# Altium schematic symbol library LimeMicroAltiumLib.SchLib: 590 symbols (part 10 of 13) (continued)
## MAX40203AUK+T_ideal_diode (continued)

## MBR0530T1G_shottky_diode
designator D?, comment MBR0530T1G
Part Description: Diode Schottky 30V 500mA Surface Mount SOD-123; Manufacturer: ON Semiconductor / Fairchild; Voltage: 30V; Average Rectified Current: 500mA; Element Configuration: Single; Max Surge Current: 5.5A; Max Reverse Leakage Current: 130uA; Forward Voltage: 430mV; Current: 5A; ComponentLink1URL: http://www.mouser.com/ds/2/427/mmsz5225-102133.pdf; ComponentLink1Description: http://www.mouser.com/ds/2/427/mmsz5225-102133.pdf; Supplier 1: Digi-Key; Manufacturer Part Number: MBR0530T1G; Stock 1: 121944; Pricing 1: 1 = 0,35000, 10 = 0,28600, 100 = 0,15180, 500 = 0,09986, 1000 = 0,06791 (USD); Mount: Surface Mount; Case/Package: SOD; Number of Pins: 2; Contact Plating: Matte,Tin; Min Operating Temperature: -65°C; Max Operating Temperature: 125°C; Package Quantity: 3000; Packaging: Tape and Reel; Max Reverse Voltage (DC): 30V; Forward Current: 500mA; Max Repetitive Reverse Voltage (Vrrm): 30V; Max Forward Surge Current (Ifsm): 5.5A; Peak Reverse Current: 130uA; Peak Non-Repetitive Surge Current: 5.5A; Length: 2.69mm; Height: 1.12mm; Width: 1.6mm; Radiation Hardening: No; REACH SVHC: No SVHC; ComponentLink2URL: http://www.farnell.com/datasheets/1708258.pdf; ComponentLink2Description: http://www.farnell.com/datasheets/1708258.pdf; ComponentLink3URL: https://www.distrelec.biz/Web/Downloads/26/_e/sz600926_e.pdf?mime=application%2Fpdf; ComponentLink3Description: https://www.distrelec.biz/Web/Downloads/26/_e/sz600926_e.pdf?mime=application%2Fpdf; ComponentLink4URL: http://www.onsemi.com/pub_link/Collateral/MBR0530T1-D.PDF; ComponentLink4Description: http://www.onsemi.com/pub_link/Collateral/MBR0530T1-D.PDF; ComponentLink5URL: http://www.alliedelec.com/m/d/65b97ea0ac6fde880d352b291ad3d7d6.pdf; ComponentLink5Description: http://www.alliedelec.com/m/d/65b97ea0ac6fde880d352b291ad3d7d6.pdf; ComponentLink6URL: http://www.farnell.com/datasheets/85890.pdf; ComponentLink6Description: http://www.farnell.com/datasheets/85890.pdf; ComponentLink7URL: http://www.onsemi.com/pub/Collateral/MBR0530T1-D.PDF; ComponentLink7Description: http://www.onsemi.com/pub/Collateral/MBR0530T1-D.PDF; Supplier Part Number 1: MBR0530T1GOSCT-ND
footprint MBR0530T1G_shottky_diode_SOD123
pins: A, C

## MBR0540T1G_shottky_diode
designator VD?, comment MBR0540T1G
Part Description: Diode Schottky 40V 500mA Surface Mount SOD-123; Manufacturer: ON Semiconductor; Manufacturer Part Number 1: MBR0540T1G; Supplier Part Number 1: MBR0540T1GOSCT-ND; Supplier 1: Digi-Key
footprint MBR0530T1G_shottky_diode_SOD123
pins: A, C

## MC100EL16DG
designator IC?
5.0 V ECL Differential Receiver; Manufacturer: ON Semiconductor; Manufacturer Part Number 1: MC100EL16DG; Supplier Part Number 1: 863-MC100EL16DG; Part Description: 5.0 V ECL Differential Receiver; Supplier 1: Mouser
footprint MC100EL16_SOIC-8
pins: 1 NC, 2 D, 3 ~{D}, 4 VBB (out), 5 VEE (power), 6 ~{Q}, 7 Q, 8 VCC (power)

## MC-1010-G_GNSS_MODULE
designator IC?, comment MC-1010-G
Part Description: LOCOSYS MC-1010-G complete standalone GNSS module; GPS, GLONASS, GALILEO, QZSS and SBAS, 99-channel GNSS, Up to 10 Hz update rate, ±11ns high accuracy time pulse (1PPS), 10.1 x 9.7 x 2 mm; Manufacturer: Locosys; Manufacturer Part Number 1: MC-1010-G; Supplier Part Number 1: MC-1010-G; Supplier 1: Locosys
footprint MC-1010-G_GNSS_MODULE
pins: 1 GND, 2 TX (out), 3 RX (in), 4 TIMEPULSE (out), 5 NC, 6 V_BCKP, 7 NC, 8 VCC (power), 9 NC, 10 GND, 11 RF_IN (in), 12 GND, 13 NC, 14 VCC_RF, 15 NC, 16 NC, 17 GPIO (io), 18 GPIO (io)

## MCP1525T-I/TT
designator IC?
2.5V Voltage Reference, 3-Pin SOT-23, Industrial Temperature, Tape and Reel; Manufacturer: Microchip Technology; Manufacturer Part Number 1: MCP1525T-I/TT; Reference Type: Series; Output Type: Fixed; Current - Output: 2mA; Tolerance: ±1%; Temperature Coefficient: 50ppm/°C; Noise - 0.1Hz to 10Hz: 90µVp-p; Noise - 10Hz to 10kHz: 500µVrms; Voltage - Input: 2.7 V ~ 5.5 V; Current - Supply: 120µA; PackageDescription: Series Voltage Reference IC ±1% 2mA SOT-23-3; Supplier 1: Digi-Key; RoHS: RoHS Compliant; Category: Integrated Circuits (ICs); Stock 1: 16612; Pricing 1: 1=0.77, 25=0.64, 100=0.58 (USD); Packaging: Digi-Reel®; Part Status: Active; Voltage - Output (Min/Fixed): 2.5V; Voltage - Output (Max): -; Current - Cathode: -; Operating Temperature: -40°C ~ 85°C (TA); Mounting Type: Surface Mount; Package / Case: TO-236-3, SC-59, SOT-23-3; Supplier Device Package: SOT-23-3; ComponentLink1URL: http://www.microchip.com/mymicrochip/filehandler.aspx?ddocname=en011331; ComponentLink1Description: http://www.microchip.com/mymicrochip/filehandler.aspx?ddocname=en011331; Supplier Part Number 1: MCP1525T-I/TTDKR-ND
footprint SOT23-3_v2 (SOT23, 3 pin)
pins: 1 IN (power), 2 OUT (power), 3 VSS (power)

## MCP3204-BI/SL
designator IC?, comment MCP3204
2.7V 4-Channel/8-Channel 12-Bit A/D Converters with SPI Serial Interface, 14-Pin SOIC 150mil, B Performance Grade, Industrial Temperature; Manufacturer: Microchip; PartNumber: MCP3204-BI/SL; DatasheetVersion: revE, Sep-2008; PackageVersion: revBB, Aug-2009; PackageReference: SOIC-SL14; PackageDescription: 14-Lead Plastic Small Outline (SL) - Narrow, 3.90mm Body [SOIC]; Supplier 1: Digi-Key; Supplier Part Number 1: MCP3204-BI/SL-ND; Supplier 2: Farnell; Supplier Part Number 2: 1852019; Supplier 3: Newark; Supplier Part Number 3: 23C2838; Supplier 4: Mouser; Supplier Part Number 4: 579-MCP3204-BI/SL; Mounting Technology: Surface Mount; Code_JEDEC: MS-012-AB; Code_IPC: SOIC127P600-14; ComponentLink1Description: Manufacturer URL; ComponentLink1URL: http://www.microchip.com/; ComponentLink2Description: Datasheet; ComponentLink2URL: http://ww1.microchip.com/downloads/en/DeviceDoc/21298e.pdf; ComponentLink3Description: Package Specification; ComponentLink3URL: http://www.microchip.com/stellent/groups/techpub_sg/documents/packagingspec/en012702.pdf
footprint SOIC-SL14_M (SOIC, 14-Leads, Body 8.7x3.9mm, Pitch 1.27mm, IPC Low Density)
pins: 1 CH0 (in), 2 CH1 (in), 3 CH2 (in), 4 CH3 (in), 5 NC, 6 NC, 7 DGND (power), 8 ~{CS}/SHDN (in), 9 DIN (in), 10 DOUT (hiz), 11 CLK (in), 12 AGND (power), 13 VREF (in), 14 VDD (power)

## MCP3208-CI/SL
designator IC?, comment MCP3208
2.7V 4-Channel/8-Channel 12-Bit A/D Converters with SPI Serial Interface, 16-Pin SOIC 150mil, C Performance Grade, Industrial Temperature; Manufacturer: Microchip; PartNumber: MCP3208-CI/SL; Manufacturer Part Number 1: MCP3208T-CI/SL; Part Description: 12 Bit Analog to Digital Converter 4, 8 Input 1 SAR 16-SOIC; PackageVersion: revBB, Aug-2009; PackageReference: SOIC-SL16; PackageDescription: 16-Lead Plastic Small Outline (SL) - Narrow, 3.90mm Body [SOIC]; Supplier 1: Digi-Key; Mounting Technology: Surface Mount; Supplier Part Number 1: MCP3208T-CI/SLCT-ND
footprint MCP3208-CI/SL_SOIC16 (SOIC, 16-Leads, Body 9.9x3.9mm, Pitch 1.27mm, IPC Low Density)
pins: 1 CH0 (in), 2 CH1 (in), 3 CH2 (in), 4 CH3 (in), 5 CH4 (in), 6 CH5 (in), 7 CH6 (in), 8 CH7 (in), 9 DGND (power), 10 ~{CS}/SHDN (in), 11 DIN (in), 12 DOUT (hiz), 13 CLK (in), 14 AGND (power), 15 VREF (in), 16 VDD (power)

## MCP4251
designator IC?
Manufacturer Part Number 1: MCP4251-103E/SL; Manufacturer: Microchip Technology; Configuration: Potentiometer; Voltage - Supply: 1.8 V ~ 5.5 V; Resistance - Wiper (Ohms) (Typ): 75; Temperature Coefficient (Typ): 150 ppm/°C; Number of Taps: 257; Interface: SPI; Memory Type: Volatile; Number of Circuits: 2; Resistance (Ohms): 10k; Supplier 1: Digi-Key; RoHS: RoHS Compliant; Category: Integrated Circuits (ICs); Features: -; Operating Temperature: -40°C ~ 125°C; Supplier Device Package: 14-SOIC; Tolerance: -; Package / Case: 14-SOIC (0.154", 3.90mm Width); Packaging: Tube; Taper: Linear; Supplier Part Number 1: MCP4251-103E/SL-ND
footprint SOIC14 (14-Pin Small Outline Integrated Circuit 1.27 mm Pitch)
pins: 1 ~{CS} (in), 2 SCK (in), 3 SDI (in), 4 VSS (in), 5 P1B (in), 6 P1W (in), 7 P1A (in), 8 P0A (in), 9 P0W (in), 10 P0B (in), 11 ~{WP} (in), 12 ~{SHDN} (in), 13 SDO (in), 14 VDD (power)

## MCP23017-E/ML_I2C_expander
designator IC?, comment MCP23017-E/ML
Part Description: I/O Expander 16 I²C 1.7 MHz 28-QFN (6x6); Manufacturer: Microchip; ComponentLink1URL: https://datasheet.ciiva.com/1496/12179-1496011.pdf?src-supplier=Element14; ComponentLink1Description: https://datasheet.ciiva.com/1496/12179-1496011.pdf?src-supplier=Element14; ComponentLink2URL: https://datasheet.ciiva.com/1780/21952b-1780121.pdf?src-supplier=Digi-Key; ComponentLink2Description: https://datasheet.ciiva.com/1780/21952b-1780121.pdf?src-supplier=Digi-Key; ComponentLink3URL: https://datasheet.ciiva.com/3149/21952b-3149158.pdf?src-supplier=Avnet; ComponentLink3Description: https://datasheet.ciiva.com/3149/21952b-3149158.pdf?src-supplier=Avnet; ComponentLink4URL: https://datasheet.ciiva.com/16222/filehandler-aspxddocname-en023709-16222331.pdf?src-supplier=Future+Electronics; ComponentLink4Description: https://datasheet.ciiva.com/16222/filehandler-aspxddocname-en023709-16222331.pdf?src-supplier=Future+Electronics; Supplier 1: Digi-Key; Supplier Part Number 1: MCP23017-E/ML-ND; Manufacturer Part Number 1: MCP23017-E/ML; Stock 1: 3965; Pricing 1: 1=1,9, 25=1,59, 100=1,44 (USD); RoHS: Yes
footprint MCP23017-E/ML_QFN28
pins: 1 GPB4 (io), 2 GPB5 (io), 3 GPB6 (io), 4 GPB7 (io), 5 VDD (power), 6 VSS (power), 7 NC, 8 SCL (in), 9 SDA (io), 10 NC, 11 A0 (in), 12 A1 (in), 13 A2 (in), 14 ~{RESET} (in), 15 INTB (oc), 16 INTA (oc), 17 GPA0 (io), 18 GPA1 (io), 19 GPA2 (io), 20 GPA3 (io), 21 GPA4 (io), 22 GPA5 (io), 23 GPA6 (io), 24 GPA7 (io), 25 GPB0 (io), 26 GPB1 (io), 27 GPB2 (io), 28 GPB3 (io), PAD GND

## MIC2033_power_switch
designator IC?, comment MIC2033
Manufacturer: Microchip; Manufacturer Part Number 1: MIC2033-05AYM6-TR; Part Description: Power Switch ICs - Power Distribution 500mA High-Side, Power Distribution Switch; Number of Outputs: 1; Interface: On/Off; Max Output Current: 500mA; Fault Protection: Over Temperature; Output Configuration: High Side; Supplier 1: Digi-Key; Supplier Part Number 1: 576-4143-1-ND; Stock 1: 1966; Pricing 1: 1=0,80000, 25=0,65720, 100=0,61500 (USD); RoHS: Yes; Mount: Surface Mount; Case/Package: SOT-23-6; Number of Pins: 6; Min Operating Temperature: -40°C; Max Operating Temperature: 125°C; Packaging: Tape and Reel; Package Quantity: 3000; Series: -; Number of Switches: 1; RoHS Compliant: Yes; ComponentLink1URL: http://www.mouser.com/ds/2/268/mic2033-b-1076865.pdf?src-supplier=Mouser; ComponentLink1Description: http://www.mouser.com/ds/2/268/mic2033-b-1076865.pdf?src-supplier=Mouser; ComponentLink2URL: http://components.arrow.com/part/dataview/56727820S413982N1374?src-supplier=Arrow+Electronics; ComponentLink2Description: http://components.arrow.com/part/dataview/56727820S413982N1374?src-supplier=Arrow+Electronics; ComponentLink3URL: http://www.microchip.com/mymicrochip/filehandler.aspx?ddocname=en579457&src-supplier=Digi-Key; ComponentLink3Description: http://www.microchip.com/mymicrochip/filehandler.aspx?ddocname=en579457&src-supplier=Digi-Key
footprint SOT23-6
pins: 1 VIN (in), 2 GND, 3 EN (in), 4 FAULT/ (out), 5 CSLEW (out), 6 VOUT (out)

## MIC37122
designator IC?
Voltage - Input: 2.375 V ~ 5.5 V; Supplier 1: Digi-Key; Supplier: Digi-Key; Package / Case: 8-SOIC (0.154", 3.90mm Width); Supplier Part Number: 576-4334-2-ND
footprint MIC37122YM TR_SO8 (SOIC, 8-Leads, Body 4,90x3,90mm, Pitch 1,27mm, IPC Medium Density)
pins: 1 EN, 2 IN, 3 OUT, 4 ADJ, 5 GND, 6 GND, 7 GND, 8 GND

## MIC38300
designator IC?
Manufacturer: Microchip Technology; Manufacturer Part Number 1: MIC38300HYHL-TR; Current - Output (Max): 3A; Voltage - Input (Min): 3V; Voltage - Input (Max): 5.5V; Voltage - Output 1: 1 ~ 5 V; Number of Outputs: 1; Supplier 1: Digi-Key; Features: OCP, OVP, UVLO; Voltage - Output 2: -; Applications: ITE (Commercial); Package / Case: 28-PowerVQFN Variant, 28-MLF®; Mounting Type: Surface Mount; RoHS: RoHS Compliant; Size / Dimension: 0.236" L x 0.158" W (6.00mm x 4.00mm); Voltage - Isolation: -; Power (Watts) - Manufacture Series: -; Type: Non-Isolated PoL Module; Efficiency: -; Voltage - Output 3: -; Packaging: Cut Tape (CT); Operating Temperature: -40°C ~ 125°C; Power (Watts) - Max: -; Category: Power Supplies - Board Mount; Supplier Part Number 1: 576-2960-1-ND
pins: 1 SWO, 2 SWO, 3 SWO, 4 SWO, 5 SWO, 6 SW, 7 ePAD, 8 AVIN, 9 LPF, 10 AGND, 11 FB, 12 LDOOUT, 13 LDOOUT, 14 LDOIN, 15 LDOIN, 16 PVIN, 17 PVIN, 18 EN, 19 PGND, 20 PGND, 21 PGND, 22 ePAD, 23 SW, 24 SW, 25 SW, 26 SW, 27 SW, 28 SW

## MICRO_SD_114-00841-68
designator J?, comment Micro SD card holder
Manufacturer: Amphenol Commercial Products; Manufacturer Part Number: 114-00841-68; Part Description: 10 (8 + 2) Position Card Connector Secure Digital - microSD™ Surface Mount, Right Angle Gold; Card Type: Secure Digital - microSD™; Number of Positions: 10 (8 + 2); Connector Type: Connector; Insertion, Removal Method: Push In, Pull Out; Supplier 1: Digi-Key; RoHS: RoHS Compliant; Category: Connectors, Interconnects; Stock 1: 5866; Pricing 1: 1=1.5, 10=1.358, 25=1.2752, 50=1.2196, 100=1.1642, 250=1.05336, 500=0.9702 (USD); Packaging: Cut Tape (CT); Part Status: Active; Ejector Side: -; Mounting Type: Surface Mount, Right Angle; Features: Switch; Height Above Board: 0.061" (1.55mm); Mounting Feature: Normal, Standard - Top; Contact Finish: Gold; Contact Finish Thickness: 15.0µin (0.38µm); ComponentLink1URL: https://www.amphenolcanada.com/ProductSearch/drawings/AC/1140084168.pdf; ComponentLink1Description: https://www.amphenolcanada.com/ProductSearch/drawings/AC/1140084168.pdf; Supplier Part Number 1: 114-00841-68-1-ND
footprint MICRO_SD_CARD_114-00841-68
pins: 1 Date Line [Bit 2], 2 Card Detect/ Data Line [Bit 3], 3 Command/Response, 4 Supply Voltage, 5 Clock, 6 GND, 7 Data Line [Bit 0], 8 Data Line [Bit 1], 12 CD_SW_B, 13 CD_SW_A

## Micro_USB3_A
designator J?, comment Micro_USB3A
footprint microUSB3A_SM
pins: 1 VBUS, 2 D-, 3 D+, 4 GND, 5 MicB_SSRX-, 6 MicB_SSRX+, 7 GND_DRAIN, 8 MicB_SSTX-, 9 MicB_SSTX+, 12 Shield

## Micro_USB3_B
designator J?, comment Micro_USB3B
Specifications: USB 3.0, Super Speed; Connector Type: USB - micro B; Supplier 1: Digi-Key; Mounting Type: Surface Mount, Right Angle, Horizontal; Category: Connectors, Interconnects; Supplier: Digi-Key; Supplier Part Number: GSB343K33HRCT-ND
pins: 1 VBUS, 2 D-, 3 D+, 4 ID, 5 GND, 6 MicB_SSTX-, 7 MicB_SSTX+, 8 GND_DRAIN, 9 MicB_SSRX-, 10 MicB_SSRX+, 11 Shield, 12 Shield

## MicroSD_card
designator J?
Supplier 1: Digi-Key; Supplier Part Number 1: HR1964CT-ND
pins: 1 DAT2, 2 CD/DAT3, 3 CMD, 4 VDD, 5 CLK, 6 VSS, 7 DAT0, 8 DAT1, 9 CD_SW_B, 10 CD_SW_A

## Mictor_38pin
designator J?
Manufacturer: TE CONNECTIVITY / AMP; Manufacturer Part Number: 2-5767004-2; Contact Termination Type: Surface Mount; Pitch Spacing: 0.64; No. of Contacts: 38; Gender: Receptacle; No. of Rows: 2; Row Pitch: 7.06; Supplier 1: Newark; Series: MICTOR; Contact Plating: Gold; Supplier Part Number 1: 24K3655
footprint AMP_MICTOR38
pins: 1 +5V, 2 DNC, 3 GND_DC, 4 DNC, 5 CLKe, 6 CLKo, 7 D15e, 8 D15o, 9 D14e, 10 D14o, 11 D13e, 12 D13o, 13 D12e, 14 D12o, 15 D11e, 16 D11o, 17 D10e, 18 D10o, 19 D9e, 20 D9o, 21 D8e, 22 D8o, 23 D7e, 24 D7o, 25 D6e, 26 D6o, 27 D5e, 28 D5o, 29 D4e, 30 D4o, 31 D3e, 32 D3o, 33 D2e, 34 D2o, 35 D1e, 36 D1o, 37 D0e, 38 D0o

## MINI_HDMI_Wurth_685119248123
designator J?, comment Mini HDMI
Also compatible with Molex 0467651301 and Amphenol 10118242-001RLF; Manufacturer: Wurth Electronics; Manufacturer Part Number 1: 685119248123; Part Description: HDMI - Micro - Receptacle Connector 19 Position Surface Mount, Right Angle; Through Hole; Body Material: Brass; Number of Contacts: 19; Gender: Receptacle; Supplier 1: RSComponents; Supplier Part Number 1: 1621823; Stock 1: 1; Pricing 1: 1000=1,80500, 5000=1,73500, 10000=1,68900, 15000=1,64400, 20000=1,60100 (USD); RoHS: Yes; Mount: Surface Mount,Horizontal; Contact Plating: Gold; Package Quantity: 1000; Packaging: Tape and Reel; Connector Type: HDMI; Features: Shielded; REACH SVHC: Unknown; RoHS Compliant: Yes; ComponentLink1URL: https://datasheet.ciiva.com/29660/685119248123-29660258.pdf?src-supplier=Digi-Key; ComponentLink1Description: https://datasheet.ciiva.com/29660/685119248123-29660258.pdf?src-supplier=Digi-Key
footprint MINI_HDMI_Wurth_685119248123 (Also compatible with Molex 0467651301 and Amphenol 10118242-001RLF)
pins: 1 Hot Plug Detect / HEAC-, 2 Utility / HEAC+, 3 TMDS Data2+, 4 TMDS Data2 Shield, 5 TMDS Data2-, 6 TMDS Data1+, 7 TMDS Data1 Shield, 8 TMDS Data1-, 9 TMDS Data0+, 10 TMDS Data0 Shield, 11 TMDS Data0-, 12 TMDS Clock+, 13 TMDS Clock Shield, 14 TMDS Clock-, 15 CEC, 16 DDC / CEC Ground / HEAC Shield, 17 SCL, 18 SDA, 19 +5V Power, Shell Shield

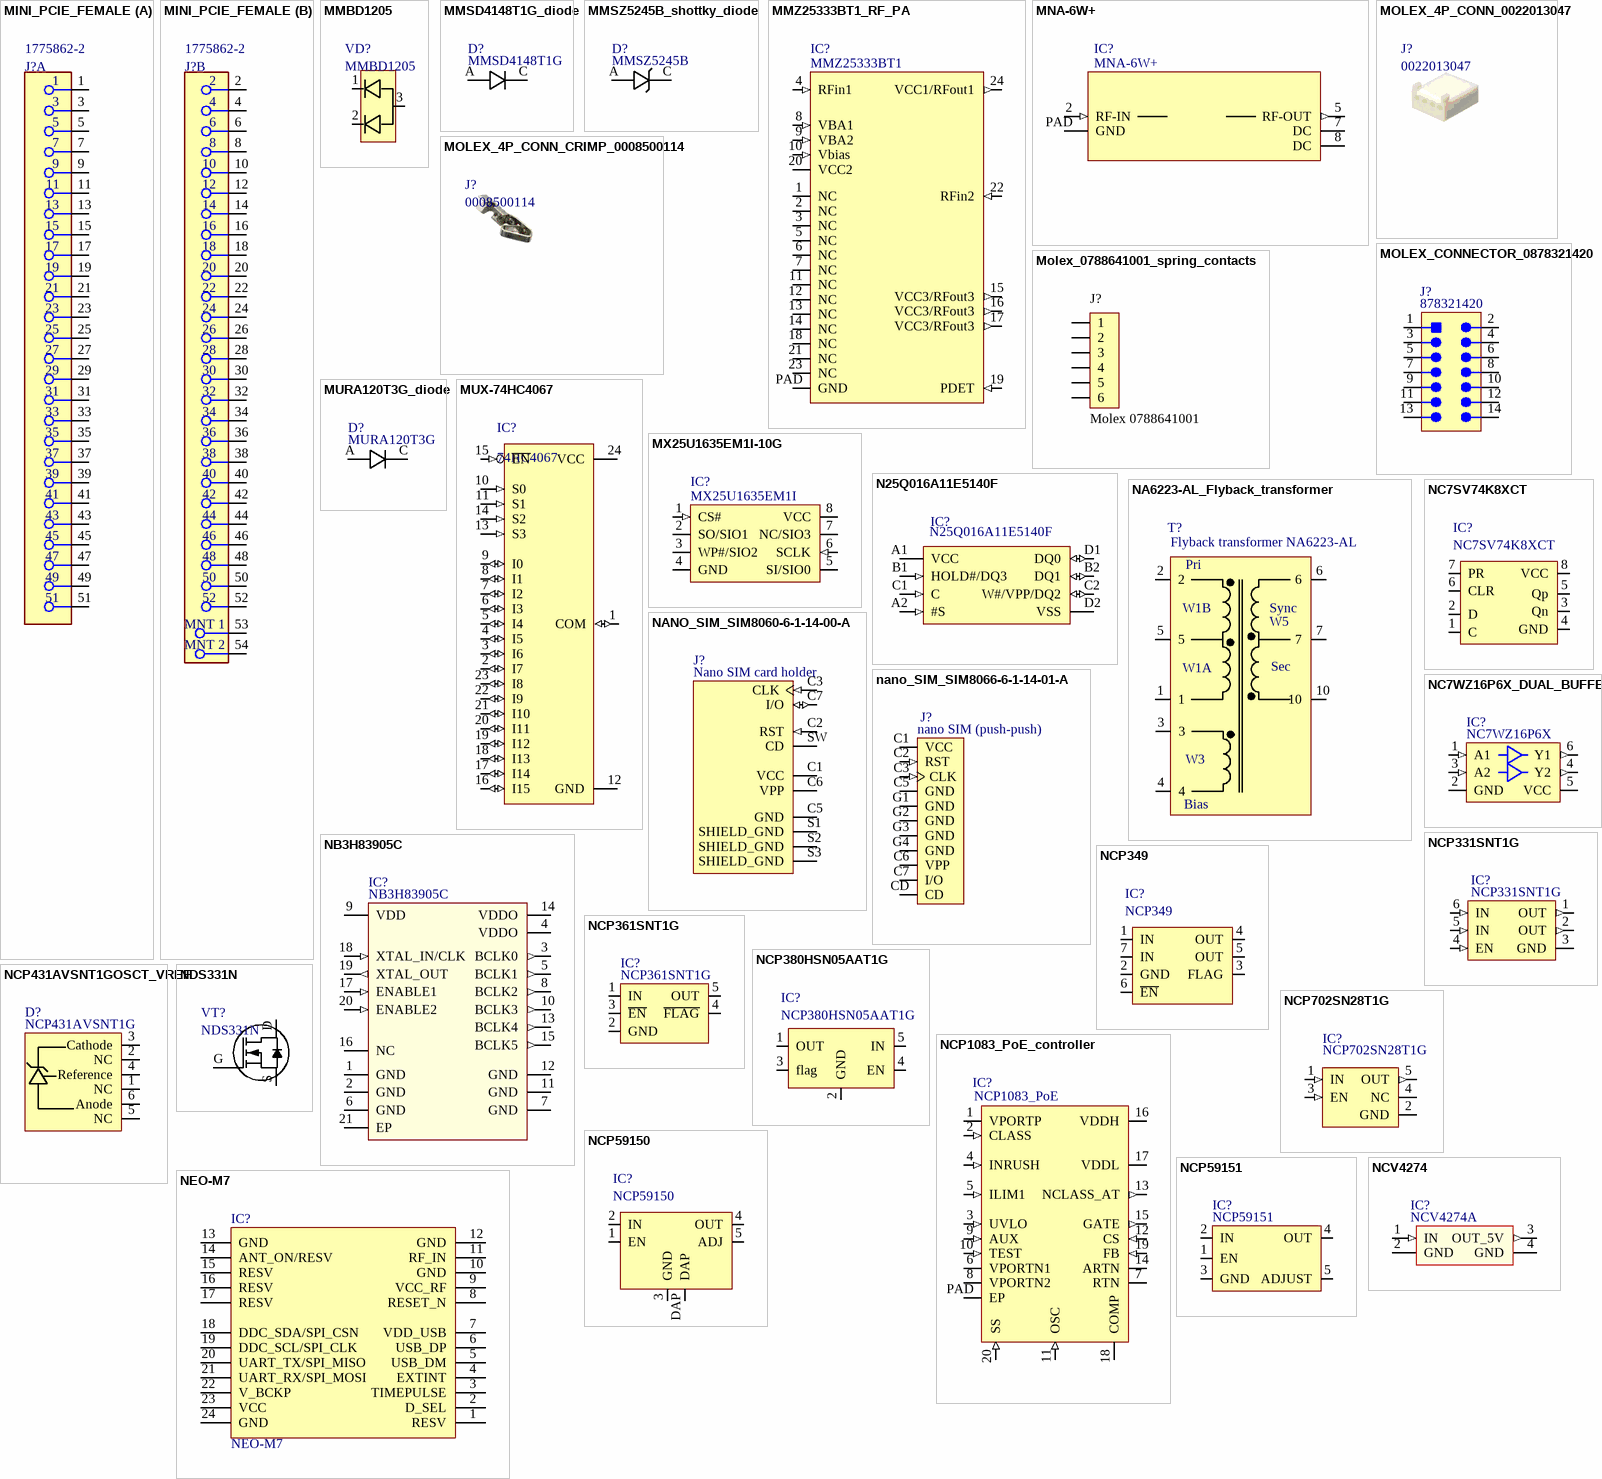
[diagram p59: symbols MINI_PCIE_FEMALE to NEO-M7]

## MINI_PCIE_FEMALE
designator J?, comment 1775862-2
CONN PCI EXP MINI FEMALE 52POS; Part Description: 52 Position Female Connector PCI Express Mini Card Gold 0.031" (0.80mm) Black; Manufacturer: TE Connectivity AMP; Manufacturer Part Number 1: 2041262-1; ComponentLink1URL: https://www.mouser.com/ds/2/418/NG_DS_8-1773459-7_EXPRESS_MINI_CARD_QRG_0816-907003.pdf?src-supplier=Mouser; ComponentLink1Description: https://www.mouser.com/ds/2/418/NG_DS_8-1773459-7_EXPRESS_MINI_CARD_QRG_0816-907003.pdf?src-supplier=Mouser; ComponentLink2URL: http://www.farnell.com/datasheets/2645681.pdf?src-supplier=Newark; ComponentLink2Description: http://www.farnell.com/datasheets/2645681.pdf?src-supplier=Newark; ComponentLink3URL: https://www.te.com/commerce/DocumentDelivery/DDEController?Action=srchrtrv&DocNm=108-99102&DocType=SS&DocLang=EN&src-supplier=Digi-Key; ComponentLink3Description: https://www.te.com/commerce/DocumentDelivery/DDEController?Action=srchrtrv&DocNm=108-99102&DocType=SS&DocLang=EN&src-supplier=Digi-Key; ComponentLink4URL: https://www.te.com/commerce/DocumentDelivery/DDEController?Action=srchrtrv&amp;DocNm=108-99102&amp;DocType=SS&amp;DocLang=EN&src-supplier=Digi-Key; ComponentLink4Description: https://www.te.com/commerce/DocumentDelivery/DDEController?Action=srchrtrv&amp;DocNm=108-99102&amp;DocType=SS&amp;DocLang=EN&src-supplier=Digi-Key; ComponentLink5URL: http://www.te.com/commerce/DocumentDelivery/DDEController?Action=showdoc&DocId=Customer+Drawing%7F2041262%7FC%7Fpdf%7FEnglish%7FENG_CD_2041262_C.pdf&src-supplier=Avnet; ComponentLink5Description: http://www.te.com/commerce/DocumentDelivery/DDEController?Action=showdoc&DocId=Customer+Drawing%7F2041262%7FC%7Fpdf%7FEnglish%7FENG_CD_2041262_C.pdf&src-supplier=Avnet; ComponentLink6URL: http://www.te.com/commerce/DocumentDelivery/DDEController?Action=srchrtrv&DocNm=2041262&DocType=Customer+Drawing&DocLang=English&src-supplier=Digi-Key; ComponentLink6Description: http://www.te.com/commerce/DocumentDelivery/DDEController?Action=srchrtrv&DocNm=2041262&DocType=Customer+Drawing&DocLang=English&src-supplier=Digi-Key; Supplier 1: Digi-Key; Supplier Part Number 1: A125147CT-ND; Stock 1: 45333; Pricing 1: 1=1,25000, 10=1,05300, 25=1,00960, 50=0,98820, 100=0,94520 (USD); RoHS: Yes
footprint MiniPCIe_connector
part A pins: 1, 3, 5, 7, 9, 11, 13, 15, 17, 19, 21, 23, 25, 27, 29, 31, 33, 35, 37, 39, 41, 43, 45, 47, 49, 51
part B pins: 2, 4, 6, 8, 10, 12, 14, 16, 18, 20, 22, 24, 26, 28, 30, 32, 34, 36, 38, 40, 42, 44, 46, 48, 50, 52, 53 MNT 1, 54 MNT 2

## MMBD1205
designator VD?
Reverse Recovery Time (trr): 4ns; Diode Configuration: 1 Pair Common Anode; Voltage - DC Reverse (Vr) (Max): 100V; Current - Average Rectified (Io) (per Diode): 200mA; Current - Reverse Leakage @ Vr: 50nA @ 50V; Voltage - Forward (Vf) (Max) @ If: 1V @ 200mA; Supplier 1: Digi-Key; Category: Discrete Semiconductor Products; Supplier Device Package: SOT-23-3 (TO-236); Package / Case: TO-236-3, SC-59, SOT-23-3; Supplier Part Number 1: MMBD1205CT-ND
footprint SOT23-3_v2 (SOT23, 3 pin)
pins: 1, 2, 3

## MMSD4148T1G_diode
designator D?, comment MMSD4148T1G
Part Description: Diode Standard 100V 200mA (DC) Surface Mount SOD-123; Manufacturer: ON Semiconductor; Manufacturer Part Number 1: MMSD4148-T1G; Forward Current: 200mA; Reverse Recovery Time: 4ns; Max Repetitive Reverse Voltage (Vrrm): 100V; Peak Non-Repetitive Surge Current: 2A; Element Configuration: Single; Forward Voltage: 1V; Peak Reverse Current: 5uA; Power Dissipation: 425mW; Polarity: Standard; Current Rating: 200A; Capacitance: 4pF; ComponentLink1URL: http://www.mouser.com/ds/2/427/mmsz5225-102133.pdf; ComponentLink1Description: http://www.mouser.com/ds/2/427/mmsz5225-102133.pdf; Supplier 1: Digi-Key; RoHS: Yes; Stock 1: 767963; Pricing 1: 1 = 0,21000, 10 = 0,19200, 100 = 0,10450, 500 = 0,06432, 1000 = 0,04386 (USD); Case/Package: SOD-123-2; Number of Pins: 2; Contact Plating: Matte,Tin; Min Operating Temperature: -55°C; Max Operating Temperature: 150°C; Recovery Time: 4ns; Max Surge Current: 2A; Package Quantity: 1; Packaging: Tape and Reel; Average Rectified Current: 200mA; Max Reverse Voltage (DC): 100V; Max Reverse Leakage Current: 5uA; Max Forward Surge Current (Ifsm): 2A; Voltage Rating (DC): 100V; Output Current: 200mA; Length: 2.69mm; Height: 1.12mm; Width: 1.6mm; Radiation Hardening: No; Lead Free: Lead Free; Halogen Free: Halogen Free; REACH SVHC: No SVHC; ComponentLink2URL: http://www.onsemi.com/pub/Collateral/MMSD4148T1-D.PDF; ComponentLink2Description: http://www.onsemi.com/pub/Collateral/MMSD4148T1-D.PDF; ComponentLink3URL: http://www.farnell.com/datasheets/1707241.pdf; ComponentLink3Description: http://www.farnell.com/datasheets/1707241.pdf; ComponentLink4URL: https://www.verical.com/server-webapp/html/getDatasheet?partID=78734; ComponentLink4Description: https://www.verical.com/server-webapp/html/getDatasheet?partID=78734; Supplier Part Number 1: MMSD4148T1GOSCT-ND
footprint MMSD4148T1G_diode_SOD123
pins: A, C

## MMSZ5245B_shottky_diode
designator D?, comment MMSZ5245B
Manufacturer: Vishay Semiconductors; Manufacturer Part Number 1: MMSZ5245B-E3-18; Part Description: Zener Diode 15V 500mW ±5% Surface Mount SOD-123; Zener Voltage: 15V; Max Power Dissipation: 500mW; Impedance: 16R; Voltage Tolerance: 5%; Peak Reverse Current: 100nA; Element Configuration: Single; Supplier 1: Digi-Key; RoHS: Yes; Stock 1: 29874; Pricing 1: 1 = 0,28000, 10 = 0,23300, 25 = 0,19480, 100 = 0,12330, 250 = 0,09516, 500 = 0,08112, 1000 = 0,05516, 2500 = 0,04975, 5000 = 0,04326 (USD); Mount: Surface Mount; Case/Package: SOD-123-2; Weight: 0.000363oz; Min Operating Temperature: -55°C; Max Operating Temperature: 150°C; Packaging: Tape and Reel; Package Quantity: 10000; Tolerance: 5%; ComponentLink1URL: http://www.mouser.com/ds/2/427/mmsz5225-102133.pdf; ComponentLink1Description: http://www.mouser.com/ds/2/427/mmsz5225-102133.pdf; Supplier Part Number 1: MMSZ5245B-E3-18GICT-ND
footprint MMSZ5245B_shottky_diode_SOD123
pins: A, C

## MMZ25333BT1_RF_PA
designator IC?, comment MMZ25333BT1
Part Description: RF Amplifier IC Cellular 1.5GHz ~ 2.7GHz 24-QFN (4x4); Manufacturer: NXP Freescale; Frequency: 2.7GHz; P1dB: 32dBm; Gain: 43dB; Operating Supply Current: 265mA; Test Frequency: 2.6GHz; Supplier 1: Digi-Key; Supplier Part Number 1: MMZ25333BT1CT-ND; Manufacturer Part Number 1: MMZ25333BT1; Stock 1: 298; Pricing 1: 1=10,02000 (USD); RoHS: Yes; Case/Package: QFN; Packaging: Tape and Reel; RoHS Compliant: Yes; ComponentLink1URL: http://www.mouser.com/ds/2/302/MMZ25333B-783850.pdf?src-supplier=Mouser; ComponentLink1Description: http://www.mouser.com/ds/2/302/MMZ25333B-783850.pdf?src-supplier=Mouser
footprint MMZ25333BT1_RF_PA_24QFN
pins: 1 NC, 2 NC, 3 NC, 4 RFin1 (in), 5 NC, 6 NC, 7 NC, 8 VBA1 (in), 9 VBA2 (in), 10 Vbias (in), 11 NC, 12 NC, 13 NC, 14 NC, 15 VCC3/RFout3 (out), 16 VCC3/RFout3 (out), 17 VCC3/RFout3 (out), 18 NC, 19 PDET (in), 20 VCC2 (power), 21 NC, 22 RFin2 (in), 23 NC, 24 VCC1/RFout1 (out), PAD GND

## MNA-6W+
designator IC?
Monolithic Amplifier 50Ω 0.5 to 5.5 GHz; Manufacturer: Mini-Circuits; Supplier Part Number 1: MNA-6W+; Supplier 1: Mini-Circuits; Part Description: Monolithic Amplifier 50Ω 0.5 to 5.5 GHz; Manufacturer Part Number 1: MNA-6W+
footprint MNA-6W+_DQ849 (Quad Flat No Lead, Plastic; 16 Terminals; Body 3 x 3 mm; Pitch 0.5 mm)
pins: 1 N/C hidden, 2 RF-IN (in), 3 N/C hidden, 4 N/C hidden, 5 RF-OUT (out), 6 N/C hidden, 7 DC (power), 8 DC (power), PAD GND

## MOLEX_4P_CONN_0022013047
designator J?, comment 0022013047  (mechanical)
Manufacturer: Molex; Part Description: 4 Position Rectangular Housing Connector Receptacle White 0.100" (2.54mm); Gender: Female; Connector Type: Socket; Number of Positions: 4; Voltage Rating: 250V; Max Current Rating: 4A; Pitch: 2.54mm; Approvals: UL; Glow Wire Compliant: Non-compliant; Supplier 1: Digi-Key; Manufacturer Part Number 1: 22-01-3047; Stock 1: 63562; Pricing 1: 1=0,20000, 10=0,18500, 25=0,15760, 50=0,13780, 100=0,12790, 250=0,11316, 500=0,10824, 1000=0,08856, 2500=0,08118 (USD); RoHS: Yes; Mount: Cable; Contact Material: Bronze; Color: White; Housing Color: White; Housing Material: Nylon; Min Operating Temperature: 0°C; Max Operating Temperature: 75°C; Package Quantity: 5000; Packaging: Bulk; Termination: Crimp; Orientation: Straight; Number of Rows: 1; Number of Contacts: 4; Number of Circuits: 4; Length: 10.72mm; Height: 6.62mm; Depth: 12.7mm; Width: 6.62mm; Radiation Hardening: No; Lead Free: Lead Free; REACH SVHC: Unknown; Halogen Free: Low Halogen; Flammability Rating: UL94 V-0; ComponentLink1URL: https://datasheet.ciiva.com/11740/0900766b812c7f18-11740520.pdf?src-supplier=RSComponents; ComponentLink1Description: https://datasheet.ciiva.com/11740/0900766b812c7f18-11740520.pdf?src-supplier=RSComponents; ComponentLink2URL: https://datasheet.ciiva.com/19472/1965550-19472976.pdf?src-supplier=Jameco; ComponentLink2Description: https://datasheet.ciiva.com/19472/1965550-19472976.pdf?src-supplier=Jameco; ComponentLink3URL: https://datasheet.ciiva.com/19454/234819-19454258.pdf?src-supplier=Jameco; ComponentLink3Description: https://datasheet.ciiva.com/19454/234819-19454258.pdf?src-supplier=Jameco; ComponentLink4URL: https://datasheet.ciiva.com/30154/0022013047-crimp-housings-30154787.pdf?src-supplier=Onlinecomponents.com; ComponentLink4Description: https://datasheet.ciiva.com/30154/0022013047-crimp-housings-30154787.pdf?src-supplier=Onlinecomponents.com; ComponentLink5URL: https://datasheet.ciiva.com/15217/getdatasheetpartid-175308-15217513.pdf?src-supplier=Verical; ComponentLink5Description: https://datasheet.ciiva.com/15217/getdatasheetpartid-175308-15217513.pdf?src-supplier=Verical; ComponentLink6URL: https://datasheet.ciiva.com/5153/0022013047-crimp-housings-158509-5153519.pdf?src-supplier=Mouser; ComponentLink6Description: https://datasheet.ciiva.com/5153/0022013047-crimp-housings-158509-5153519.pdf?src-supplier=Mouser; ComponentLink7URL: https://datasheet.ciiva.com/16660/0022013047-crimp-housings-16660631.pdf?src-supplier=Avnet+Europe; ComponentLink7Description: https://datasheet.ciiva.com/16660/0022013047-crimp-housings-16660631.pdf?src-supplier=Avnet+Europe; ComponentLink8URL: https://datasheet.ciiva.com/16744/0022013047-crimp-housings-16744236.pdf?src-supplier=Avnet+Europe; ComponentLink8Description: https://datasheet.ciiva.com/16744/0022013047-crimp-housings-16744236.pdf?src-supplier=Avnet+Europe; ComponentLink9URL: https://datasheet.ciiva.com/16468/0022013047-crimp-housings-16468669.pdf?src-supplier=Avnet+Asia; ComponentLink9Description: https://datasheet.ciiva.com/16468/0022013047-crimp-housings-16468669.pdf?src-supplier=Avnet+Asia; Supplier Part Number 1: WM2002-ND

## MOLEX_4P_CONN_CRIMP_0008500114
designator J?, comment 0008500114  (mechanical)
Part Description: Non-Gendered Contact Tin 22-30 AWG Crimp; Manufacturer: Molex; Current Rating: 3A; Voltage Rating: 250V; Connector Type: Socket; Gender: Female; Max Current Rating: 9A; Contact Resistance: 20mR; Number of Contacts: 1; Shielding: Unshielded; Wire Gauge (Max): 22AWG; Wire Gauge (Min): 30AWG; ComponentLink1URL: https://datasheet.ciiva.com/11740/0900766b812c7f18-11740520.pdf?src-supplier=RSComponents; ComponentLink1Description: https://datasheet.ciiva.com/11740/0900766b812c7f18-11740520.pdf?src-supplier=RSComponents; ComponentLink2URL: https://datasheet.ciiva.com/19472/1965550-19472976.pdf?src-supplier=Jameco; ComponentLink2Description: https://datasheet.ciiva.com/19472/1965550-19472976.pdf?src-supplier=Jameco; ComponentLink3URL: https://datasheet.ciiva.com/19454/234819-19454258.pdf?src-supplier=Jameco; ComponentLink3Description: https://datasheet.ciiva.com/19454/234819-19454258.pdf?src-supplier=Jameco; ComponentLink4URL: https://datasheet.ciiva.com/30154/0022013047-crimp-housings-30154787.pdf?src-supplier=Onlinecomponents.com; ComponentLink4Description: https://datasheet.ciiva.com/30154/0022013047-crimp-housings-30154787.pdf?src-supplier=Onlinecomponents.com; ComponentLink5URL: https://datasheet.ciiva.com/15217/getdatasheetpartid-175308-15217513.pdf?src-supplier=Verical; ComponentLink5Description: https://datasheet.ciiva.com/15217/getdatasheetpartid-175308-15217513.pdf?src-supplier=Verical; ComponentLink6URL: https://datasheet.ciiva.com/5153/0022013047-crimp-housings-158509-5153519.pdf?src-supplier=Mouser; ComponentLink6Description: https://datasheet.ciiva.com/5153/0022013047-crimp-housings-158509-5153519.pdf?src-supplier=Mouser; ComponentLink7URL: https://datasheet.ciiva.com/16660/0022013047-crimp-housings-16660631.pdf?src-supplier=Avnet+Europe; ComponentLink7Description: https://datasheet.ciiva.com/16660/0022013047-crimp-housings-16660631.pdf?src-supplier=Avnet+Europe; ComponentLink8URL: https://datasheet.ciiva.com/16744/0022013047-crimp-housings-16744236.pdf?src-supplier=Avnet+Europe; ComponentLink8Description: https://datasheet.ciiva.com/16744/0022013047-crimp-housings-16744236.pdf?src-supplier=Avnet+Europe; ComponentLink9URL: https://datasheet.ciiva.com/16468/0022013047-crimp-housings-16468669.pdf?src-supplier=Avnet+Asia; ComponentLink9Description: https://datasheet.ciiva.com/16468/0022013047-crimp-housings-16468669.pdf?src-supplier=Avnet+Asia; Supplier 1: Digi-Key; Supplier Part Number 1: WM1114-ND; Manufacturer Part Number 1: 08-50-0114; Stock 1: 561832; Pricing 1: 1=0,17000, 10=0,16300, 25=0,12120, 50=0,10380, 100=0,10030, 250=0,08652, 500=0,08304, 1000=0,07266, 2500=0,06574 (USD); RoHS: Yes; Mount: Cable; Contact Material: Brass; Contact Plating: Tin; Min Operating Temperature: -40°C; Max Operating Temperature: 105°C; Package Quantity: 2000; Contact Gender: Female; Termination: Crimp; Packaging: Bulk; Orientation: Straight; Max Voltage Rating (AC): 250V; Length: 9.7mm; Height: 3.68mm; Wire/Cable Gauge: 30AWG; Depth: 2.1mm; Radiation Hardening: No; Lead Free: Lead Free; REACH SVHC: Unknown; ComponentLink10URL: https://datasheet.ciiva.com/30066/271690008500114-crimp-terminals-30066772.pdf?src-supplier=Onlinecomponents.com; ComponentLink10Description: https://datasheet.ciiva.com/30066/271690008500114-crimp-terminals-30066772.pdf?src-supplier=Onlinecomponents.com; ComponentLink11URL: https://datasheet.ciiva.com/5156/0008500114-crimp-terminals-227200-5156842.pdf?src-supplier=Mouser; ComponentLink11Description: https://datasheet.ciiva.com/5156/0008500114-crimp-terminals-227200-5156842.pdf?src-supplier=Mouser; ComponentLink12URL: https://datasheet.ciiva.com/19454/234923-19454299.pdf?src-supplier=Jameco; ComponentLink12Description: https://datasheet.ciiva.com/19454/234923-19454299.pdf?src-supplier=Jameco; ComponentLink13URL: https://datasheet.ciiva.com/11723/0900766b8131f4fe-11723637.pdf?src-supplier=RSComponents; ComponentLink13Description: https://datasheet.ciiva.com/11723/0900766b8131f4fe-11723637.pdf?src-supplier=RSComponents; ComponentLink14URL: https://datasheet.ciiva.com/16132/1527990008500114-crimp-terminals-16132422.pdf?src-supplier=Onlinecomponents.com; ComponentLink14Description: https://datasheet.ciiva.com/16132/1527990008500114-crimp-terminals-16132422.pdf?src-supplier=Onlinecomponents.com